# Altium schematic symbol library Minh_Lib.SchLib: 619 symbols (part 3 of 4) (continued)
## EEE-1VA101UP
designator EEE?  Supplier Part Number 1: PCE3950DKR-ND
Aluminum Electrolytic Capacitor, 100UF, 35V, 20%, SMD, Full Reel; Manufacturer: Panasonic; Manufacturer Part Number: EEE-1VA101UP; Dielectric Material: Aluminium; Ripple Current: 140mA; Polarity: Polar; Life (Hours): 2000Hour; Leakage Current: 35uA; Supplier 1: Digi-Key; RoHS: Yes; Category: Aluminum Electrolytic Capacitors; Pricing 1: 1=0.65000, 10=0.46000, 50=0.34760, 100=0.30270 (USD); Mount: Surface Mount,PCB; Case/Package: Radial; Contact Plating: Tin; Min Operating Temperature: -40°C; Max Operating Temperature: 85°C; Capacitance: 100uF; Tolerance: 20%; Voltage Rating: 35V; Packaging: Tape and Reel; Voltage Rating (DC): 35V; Package Quantity: 500; Termination: SMD/SMT; Ripple Current (AC): 140mA; Voltage: 35V; Series: S; Construction: Cylindrical; Diameter: 8mm; Length: 10.5mm; Height: 10.2mm; Height - Seated (Max): 0.402inch; Radiation Hardening: No; Lead Free: Lead Free; RoHS Compliant: Yes; REACH SVHC: No SVHC; ComponentLink1URL: https://datasheet.ciiva.com/43470/aba0000ce2-43470686.pdf?src-supplier=Farnell; ComponentLink1Description: https://datasheet.ciiva.com/43470/aba0000ce2-43470686.pdf?src-supplier=Farnell; ComponentLink2URL: https://datasheet.ciiva.com/46378/aba0000ce2-46378343.pdf?src-supplier=Element14; ComponentLink2Description: https://datasheet.ciiva.com/46378/aba0000ce2-46378343.pdf?src-supplier=Element14; ComponentLink3URL: https://datasheet.ciiva.com/31414/aba0000ce2-31414694.pdf?src-supplier=Farnell; ComponentLink3Description: https://datasheet.ciiva.com/31414/aba0000ce2-31414694.pdf?src-supplier=Farnell; ComponentLink4URL: https://datasheet.ciiva.com/46374/aba0000ce2-46374429.pdf?src-supplier=Element14; ComponentLink4Description: https://datasheet.ciiva.com/46374/aba0000ce2-46374429.pdf?src-supplier=Element14; ComponentLink5URL: https://datasheet.ciiva.com/24024/aba0000ce2-40801-24024846.pdf?src-supplier=Mouser; ComponentLink5Description: https://datasheet.ciiva.com/24024/aba0000ce2-40801-24024846.pdf?src-supplier=Mouser; ComponentLink6URL: https://datasheet.ciiva.com/14601/70255710-14601464.pdf?src-supplier=Allied+Electronics; ComponentLink6Description: https://datasheet.ciiva.com/14601/70255710-14601464.pdf?src-supplier=Allied+Electronics; ComponentLink7URL: https://datasheet.ciiva.com/14599/70255710-14599016.pdf?src-supplier=Allied+Electronics; ComponentLink7Description: https://datasheet.ciiva.com/14599/70255710-14599016.pdf?src-supplier=Allied+Electronics; ComponentLink8URL: https://datasheet.ciiva.com/11680/aba0000ce2-11680429.pdf?src-supplier=Avnet; ComponentLink8Description: https://datasheet.ciiva.com/11680/aba0000ce2-11680429.pdf?src-supplier=Avnet; ComponentLink9URL: https://datasheet.ciiva.com/16212/aba0000ce2-16212218.pdf?src-supplier=Future+Electronics; ComponentLink9Description: https://datasheet.ciiva.com/16212/aba0000ce2-16212218.pdf?src-supplier=Future+Electronics; ComponentLink10URL: https://datasheet.ciiva.com/17535/aba0000ce2-17535486.pdf?src-supplier=Avnet+Europe; ComponentLink10Description: https://datasheet.ciiva.com/17535/aba0000ce2-17535486.pdf?src-supplier=Avnet+Europe
footprint CAPACITOR/ALU - SIZE F/SMD - 8X10.2 (CAPACITOR  -  ALUMINIUM - SIZE F / EEEFK - SMD)
pins: 1, 2
text: +

## EEE-1VA101XP
designator EEE?  Supplier Part Number 1: 1763750
Cap Aluminum 100uF 35V 20% (6.3 X 7.7mm) SMD 132mA 2000 hr 85°C T/R; Manufacturer: Panasonic; Manufacturer Part Number: EEE-1VA101XP; Polarity: Polar; Life (Hours): 2000Hour; Leakage Current: 3uA; Supplier 1: RSComponents; RoHS: Yes; Category: Aluminum Electrolytic Capacitors; Stock 1: 375; Pricing 1: 900=0.19000, 900=0.13700 (USD); Mount: Surface Mount,PCB; Case/Package: Radial; Number of Pins: 8; Contact Plating: Tin; Min Operating Temperature: -40°C; Max Operating Temperature: 85°C; Capacitance: 100uF; Voltage Rating: 35V; Tolerance: 20%; Ripple Current: 132mA; Packaging: Tape and Reel; Package Quantity: 900; Voltage Rating (DC): 35V; Termination: SMD/SMT; Ripple Current (AC): 132mA; Voltage: 35V; Series: S; Construction: Cylindrical; Diameter: 6.3mm; Length: 8mm; Height: 7.7mm; Height - Seated (Max): 0.303inch; Radiation Hardening: No; Lead Free: Lead Free; RoHS Compliant: Yes; REACH SVHC: No SVHC; ComponentLink1URL: https://datasheet.ciiva.com/46378/aba0000ce2-46378341.pdf?src-supplier=Element14; ComponentLink1Description: https://datasheet.ciiva.com/46378/aba0000ce2-46378341.pdf?src-supplier=Element14; ComponentLink2URL: https://datasheet.ciiva.com/31414/aba0000ce2-31414696.pdf?src-supplier=Farnell; ComponentLink2Description: https://datasheet.ciiva.com/31414/aba0000ce2-31414696.pdf?src-supplier=Farnell; ComponentLink3URL: https://datasheet.ciiva.com/46374/aba0000ce2-46374427.pdf?src-supplier=Element14; ComponentLink3Description: https://datasheet.ciiva.com/46374/aba0000ce2-46374427.pdf?src-supplier=Element14; ComponentLink4URL: https://datasheet.ciiva.com/24068/aba0000ce2-40801-24068089.pdf?src-supplier=Mouser; ComponentLink4Description: https://datasheet.ciiva.com/24068/aba0000ce2-40801-24068089.pdf?src-supplier=Mouser; ComponentLink5URL: https://datasheet.ciiva.com/14591/70255710-14591771.pdf?src-supplier=Allied+Electronics; ComponentLink5Description: https://datasheet.ciiva.com/14591/70255710-14591771.pdf?src-supplier=Allied+Electronics; ComponentLink6URL: https://datasheet.ciiva.com/14600/70255710-14600731.pdf?src-supplier=Allied+Electronics; ComponentLink6Description: https://datasheet.ciiva.com/14600/70255710-14600731.pdf?src-supplier=Allied+Electronics; ComponentLink7URL: https://datasheet.ciiva.com/11673/aba0000ce2-11673887.pdf?src-supplier=Avnet; ComponentLink7Description: https://datasheet.ciiva.com/11673/aba0000ce2-11673887.pdf?src-supplier=Avnet; ComponentLink8URL: https://datasheet.ciiva.com/30170/11aba0000ce2-30170103.pdf?src-supplier=Onlinecomponents.com; ComponentLink8Description: https://datasheet.ciiva.com/30170/11aba0000ce2-30170103.pdf?src-supplier=Onlinecomponents.com; ComponentLink9URL: https://datasheet.ciiva.com/17535/aba0000ce2-17535510.pdf?src-supplier=Avnet+Europe; ComponentLink9Description: https://datasheet.ciiva.com/17535/aba0000ce2-17535510.pdf?src-supplier=Avnet+Europe
footprint CAPACITOR/ALU - SIZE D8/SMD - 6.3X7.7 (CAPACITOR  -  ALUMINIUM - SIZE D8 / EEEFK - SMD)
pins: 1, 2
text: +

## EEE-1VA220SP
designator EEE?  Supplier Part Number 1: 5370023
Cap Aluminum 22uF 35V 20% (6.3 X 5.4mm) SMD 60mA 2000h 85 C T/R; Manufacturer: Panasonic; Manufacturer Part Number: EEE-1VA220SP; Dielectric Material: Aluminium; Life (Hours): 2000Hour; Leakage Current: 3uA; Lead Length: 2.6mm; Supplier 1: RSComponents; RoHS: Yes; Category: Aluminum Electrolytic Capacitors; Stock 1: 95; Pricing 1: 5=0.29900, 50=0.15500, 250=0.10500, 500=0.10000, 2500=0.08300, 5=0.21600, 50=0.11200, 250=0.07600, 500=0.07200, 2500=0.06000 (USD); Mount: Surface Mount,PCB; Case/Package: Radial; Number of Pins: 2; Contact Plating: Tin; Min Operating Temperature: -40°C; Max Operating Temperature: 85°C; Capacitance: 22uF; Tolerance: 20%; Voltage Rating (DC): 35V; Voltage Rating: 35V; Packaging: Tape and Reel; Package Quantity: 1; Termination: SMD/SMT; Series: S; Construction: Cylindrical; Ripple Current: 60mA; Ripple Current (AC): 60mA; Voltage: 35V; Diameter: 6.3mm; Length: 5.5mm; Width: 6.6mm; Height: 5.4mm; Height - Seated (Max): 0.213inch; Lead Pitch: 1.8mm; Radiation Hardening: No; Lead Free: Lead Free; RoHS Compliant: Yes; REACH SVHC: No SVHC; ComponentLink1URL: https://datasheet.ciiva.com/11778/0900766b8078636e-11778914.pdf?src-supplier=RSComponents; ComponentLink1Description: https://datasheet.ciiva.com/11778/0900766b8078636e-11778914.pdf?src-supplier=RSComponents; ComponentLink2URL: https://datasheet.ciiva.com/15166/getdatasheetpartid-135375-15166031.pdf?src-supplier=Verical; ComponentLink2Description: https://datasheet.ciiva.com/15166/getdatasheetpartid-135375-15166031.pdf?src-supplier=Verical; ComponentLink3URL: https://datasheet.ciiva.com/6085/aba0000ce2-6085109.pdf?src-supplier=Farnell; ComponentLink3Description: https://datasheet.ciiva.com/6085/aba0000ce2-6085109.pdf?src-supplier=Farnell; ComponentLink4URL: https://datasheet.ciiva.com/46376/aba0000ce2-46376415.pdf?src-supplier=Element14; ComponentLink4Description: https://datasheet.ciiva.com/46376/aba0000ce2-46376415.pdf?src-supplier=Element14
footprint CAPACITOR/ALU - SIZE D/SMD - 6.3X5.4 (CAPACITOR  -  ALUMINIUM - SIZE D / EEEFK - SMD)
pins: 1, 2
text: +

## EEE-1VA220WR
designator EEE?  Supplier Part Number 1: EEE-1VA220WR
Cap Aluminum 22uF 35V 20% (5 X 5.4mm) SMD 36mA 1000 hr 85°C T/R; Manufacturer: Panasonic; Dielectric Material: Aluminium; Life (Hours): 1000Hour; Leakage Current: 7.7uA; Supplier 1: Arrow Electronics; Manufacturer Part Number: EEE-1VA220WR; RoHS: Yes; Category: Aluminum Electrolytic Capacitors; Stock 1: 1; Pricing 1: 1=0.16660 (USD); Mount: Surface Mount,PCB; Case/Package: Radial; Contact Plating: Tin; Min Operating Temperature: -40°C; Max Operating Temperature: 85°C; Capacitance: 22uF; Tolerance: 20%; Voltage Rating (DC): 35V; Voltage Rating: 35V; Packaging: Tape and Reel; Package Quantity: 1; Termination: SMD/SMT; Ripple Current (AC): 36mA; Ripple Current: 36mA; Voltage: 35V; Series: S; Construction: Cylindrical; Diameter: 5mm; Length: 5.5mm; Height: 5.4mm; Height - Seated (Max): 0.213inch; Radiation Hardening: No; REACH SVHC: No SVHC; Lead Free: Lead Free; RoHS Compliant: Yes; ComponentLink1URL: https://datasheet.ciiva.com/31414/aba0000ce2-31414697.pdf?src-supplier=Farnell; ComponentLink1Description: https://datasheet.ciiva.com/31414/aba0000ce2-31414697.pdf?src-supplier=Farnell; ComponentLink2URL: https://datasheet.ciiva.com/46374/aba0000ce2-46374426.pdf?src-supplier=Element14; ComponentLink2Description: https://datasheet.ciiva.com/46374/aba0000ce2-46374426.pdf?src-supplier=Element14; ComponentLink3URL: https://datasheet.ciiva.com/24027/aba0000ce2-40801-24027849.pdf?src-supplier=Mouser; ComponentLink3Description: https://datasheet.ciiva.com/24027/aba0000ce2-40801-24027849.pdf?src-supplier=Mouser; ComponentLink4URL: https://datasheet.ciiva.com/14604/70255710-14604703.pdf?src-supplier=Allied+Electronics; ComponentLink4Description: https://datasheet.ciiva.com/14604/70255710-14604703.pdf?src-supplier=Allied+Electronics; ComponentLink5URL: https://datasheet.ciiva.com/2983/aba0000ce2-2983925.pdf?src-supplier=Avnet; ComponentLink5Description: https://datasheet.ciiva.com/2983/aba0000ce2-2983925.pdf?src-supplier=Avnet; ComponentLink6URL: https://datasheet.ciiva.com/16388/aba0000ce2-16388681.pdf?src-supplier=Future+Electronics; ComponentLink6Description: https://datasheet.ciiva.com/16388/aba0000ce2-16388681.pdf?src-supplier=Future+Electronics; ComponentLink7URL: https://datasheet.ciiva.com/2985/aba0000ce2-2985217.pdf?src-supplier=Avnet; ComponentLink7Description: https://datasheet.ciiva.com/2985/aba0000ce2-2985217.pdf?src-supplier=Avnet; ComponentLink8URL: https://datasheet.ciiva.com/17536/aba0000ce2-17536586.pdf?src-supplier=Avnet+Europe; ComponentLink8Description: https://datasheet.ciiva.com/17536/aba0000ce2-17536586.pdf?src-supplier=Avnet+Europe
footprint CAPACITOR/ALU - SIZE C/SMD - 5X5.4 (CAPACITOR  -  ALUMINIUM - SIZE C / EEEFK - SMD)
pins: 1, 2
text: +

## EEE-1VA221P
designator EEE?  Supplier Part Number 1: EEE-1VA221P
Cap Aluminum 220uF 35V 20% (10 X 10.2mm) SMD 310mA 2000h 85°C T/R; Manufacturer: Panasonic; Life (Hours): 2000Hour; Leakage Current: 3uA; Dissipation Factor: 0.14%; Supplier 1: Arrow Electronics; Manufacturer Part Number: EEE-1VA221P; RoHS: Yes; Category: Aluminum Electrolytic Capacitors; Stock 1: 1; Pricing 1: 1=0.55570 (USD); Mount: Surface Mount,PCB; Case/Package: Radial; Contact Plating: Tin; Min Operating Temperature: -40°C; Max Operating Temperature: 85°C; Capacitance: 220uF; Tolerance: 20%; Voltage Rating: 35V; Voltage Rating (DC): 35V; Packaging: Tape and Reel; Ripple Current: 310mA; Package Quantity: 1; Termination: SMD/SMT; Series: S; Ripple Current (AC): 310mA; Voltage: 35V; Construction: Cylindrical; Diameter: 10mm; Length: 10.2mm; Height: 10.2mm; Height - Seated (Max): 0.402inch; Radiation Hardening: No; RoHS Compliant: Yes; REACH SVHC: No SVHC; Lead Free: Lead Free; ComponentLink1URL: https://datasheet.ciiva.com/11779/0900766b808a016a-11779838.pdf?src-supplier=RSComponents; ComponentLink1Description: https://datasheet.ciiva.com/11779/0900766b808a016a-11779838.pdf?src-supplier=RSComponents; ComponentLink2URL: https://datasheet.ciiva.com/31414/aba0000ce2-31414698.pdf?src-supplier=Farnell; ComponentLink2Description: https://datasheet.ciiva.com/31414/aba0000ce2-31414698.pdf?src-supplier=Farnell; ComponentLink3URL: https://datasheet.ciiva.com/46374/aba0000ce2-46374425.pdf?src-supplier=Element14; ComponentLink3Description: https://datasheet.ciiva.com/46374/aba0000ce2-46374425.pdf?src-supplier=Element14; ComponentLink4URL: https://datasheet.ciiva.com/24069/aba0000ce2-40801-24069609.pdf?src-supplier=Mouser; ComponentLink4Description: https://datasheet.ciiva.com/24069/aba0000ce2-40801-24069609.pdf?src-supplier=Mouser; ComponentLink5URL: https://datasheet.ciiva.com/14592/70255710-14592303.pdf?src-supplier=Allied+Electronics; ComponentLink5Description: https://datasheet.ciiva.com/14592/70255710-14592303.pdf?src-supplier=Allied+Electronics; ComponentLink6URL: https://datasheet.ciiva.com/2985/aba0000ce2-2985220.pdf?src-supplier=Avnet; ComponentLink6Description: https://datasheet.ciiva.com/2985/aba0000ce2-2985220.pdf?src-supplier=Avnet; ComponentLink7URL: https://datasheet.ciiva.com/16432/aba0000ce2-16432892.pdf?src-supplier=Future+Electronics; ComponentLink7Description: https://datasheet.ciiva.com/16432/aba0000ce2-16432892.pdf?src-supplier=Future+Electronics; ComponentLink8URL: https://datasheet.ciiva.com/2985/aba0000ce2-2985221.pdf?src-supplier=Avnet; ComponentLink8Description: https://datasheet.ciiva.com/2985/aba0000ce2-2985221.pdf?src-supplier=Avnet; ComponentLink9URL: https://datasheet.ciiva.com/30062/11aba0000ce2-30062150.pdf?src-supplier=Onlinecomponents.com; ComponentLink9Description: https://datasheet.ciiva.com/30062/11aba0000ce2-30062150.pdf?src-supplier=Onlinecomponents.com; ComponentLink10URL: https://datasheet.ciiva.com/17537/aba0000ce2-17537193.pdf?src-supplier=Avnet+Europe; ComponentLink10Description: https://datasheet.ciiva.com/17537/aba0000ce2-17537193.pdf?src-supplier=Avnet+Europe; ComponentLink11URL: https://datasheet.ciiva.com/16539/aba0000ce2-16539957.pdf?src-supplier=Avnet+Asia; ComponentLink11Description: https://datasheet.ciiva.com/16539/aba0000ce2-16539957.pdf?src-supplier=Avnet+Asia
footprint CAPACITOR/ALU - SIZE G/SMD - 10X10.2 (CAPACITOR  -  ALUMINIUM - SIZE G / EEEFK - SMD)
pins: 1, 2
text: +

## EEE-1VA221UP
designator EEE?  Supplier Part Number 1: 1763751
Cap Aluminum 220uF 35V 20% (8 X 10.2mm) SMD 200mA 2000h 85°C T/R; Manufacturer: Panasonic; Manufacturer Part Number: EEE-1VA221UP; Life (Hours): 2000Hour; Supplier 1: RSComponents; RoHS: Yes; Category: Aluminum Electrolytic Capacitors; Stock 1: 21; Pricing 1: 500=0.39200, 1000=0.37700, 2000=0.36400, 4000=0.32100, 500=0.28300, 1000=0.27200, 2000=0.26300, 4000=0.23200 (USD); Mount: Surface Mount,PCB; Case/Package: Radial; Contact Plating: Tin; Min Operating Temperature: -40°C; Max Operating Temperature: 85°C; Packaging: Tape and Reel; Capacitance: 220uF; Tolerance: 20%; Voltage Rating: 35V; Ripple Current: 200mA; Package Quantity: 1; Voltage Rating (DC): 35V; Termination: SMD/SMT; Series: S; Ripple Current (AC): 200mA; Construction: Cylindrical; Diameter: 8mm; Length: 10.5mm; Height: 10.2mm; Height - Seated (Max): 0.402inch; Radiation Hardening: No; REACH SVHC: Unknown; Lead Free: Lead Free; RoHS Compliant: Yes; ComponentLink1URL: https://datasheet.ciiva.com/14605/70255710-14605118.pdf?src-supplier=Allied+Electronics; ComponentLink1Description: https://datasheet.ciiva.com/14605/70255710-14605118.pdf?src-supplier=Allied+Electronics; ComponentLink2URL: https://datasheet.ciiva.com/14591/70255710-14591990.pdf?src-supplier=Allied+Electronics; ComponentLink2Description: https://datasheet.ciiva.com/14591/70255710-14591990.pdf?src-supplier=Allied+Electronics; ComponentLink3URL: https://datasheet.ciiva.com/2985/aba0000ce2-2985224.pdf?src-supplier=Avnet; ComponentLink3Description: https://datasheet.ciiva.com/2985/aba0000ce2-2985224.pdf?src-supplier=Avnet; ComponentLink4URL: https://datasheet.ciiva.com/16201/aba0000ce2-16201527.pdf?src-supplier=Future+Electronics; ComponentLink4Description: https://datasheet.ciiva.com/16201/aba0000ce2-16201527.pdf?src-supplier=Future+Electronics
footprint CAPACITOR/ALU - SIZE F/SMD - 8X10.2 (CAPACITOR  -  ALUMINIUM - SIZE F / EEEFK - SMD)
pins: 1, 2
text: +

## EEE-1VA330P
designator EEE?  Supplier Part Number 1: PCE3956CT-ND
Cap Aluminum 33uF 35V 20% (8 X 6.2mm) SMD 130mA 2000 hr 85°C T/R; Manufacturer: Panasonic; Manufacturer Part Number: EEE-1VA330P; Life (Hours): 2000Hour; Supplier 1: Digi-Key; RoHS: Yes; Category: Aluminum Electrolytic Capacitors; Stock 1: 37; Pricing 1: 1=0.50000, 10=0.35500, 50=0.26800, 100=0.23350, 500=0.17296 (USD); Mount: Surface Mount,PCB; Case/Package: Radial; Min Operating Temperature: -40°C; Max Operating Temperature: 85°C; Capacitance: 33uF; Tolerance: 20%; Voltage Rating (DC): 35V; Ripple Current: 130mA; Voltage Rating: 35V; Packaging: Tape and Reel; Package Quantity: 1000; Termination: SMD/SMT; Series: S; Construction: Cylindrical; Diameter: 8mm; Length: 6.5mm; Height: 6.2mm; Height - Seated (Max): 0.244inch; Radiation Hardening: No; Lead Free: Lead Free; RoHS Compliant: Yes; ComponentLink1URL: https://datasheet.ciiva.com/14604/70255710-14604362.pdf?src-supplier=Allied+Electronics; ComponentLink1Description: https://datasheet.ciiva.com/14604/70255710-14604362.pdf?src-supplier=Allied+Electronics; ComponentLink2URL: https://datasheet.ciiva.com/17535/aba0000ce2-17535548.pdf?src-supplier=Avnet+Europe; ComponentLink2Description: https://datasheet.ciiva.com/17535/aba0000ce2-17535548.pdf?src-supplier=Avnet+Europe; ComponentLink3URL: https://datasheet.ciiva.com/30217/11aba0000ce2-30217101.pdf?src-supplier=Onlinecomponents.com; ComponentLink3Description: https://datasheet.ciiva.com/30217/11aba0000ce2-30217101.pdf?src-supplier=Onlinecomponents.com; ComponentLink4URL: https://datasheet.ciiva.com/10330/aba0000ce2-10330999.pdf?src-supplier=Avnet; ComponentLink4Description: https://datasheet.ciiva.com/10330/aba0000ce2-10330999.pdf?src-supplier=Avnet; ComponentLink5URL: https://datasheet.ciiva.com/24026/aba0000ce2-40801-24026328.pdf?src-supplier=Mouser; ComponentLink5Description: https://datasheet.ciiva.com/24026/aba0000ce2-40801-24026328.pdf?src-supplier=Mouser
footprint CAPACITOR/ALU - SIZE E/SMD - 8X6.2 (CAPACITOR  -  ALUMINIUM - SIZE E / EEEFK - SMD)
pins: 1, 2
text: +

## EEE-1VA330WP
designator EEE?  Supplier Part Number 1: EEE-1VA330WP
Cap Aluminum 33uF 35V 20% (6.3 X 5.4mm) SMD 60mA 1000 hr 85°C T/R; Manufacturer: Panasonic; Life (Hours): 1000Hour; Supplier 1: Arrow Electronics; Manufacturer Part Number: EEE-1VA330WP; RoHS: Yes; Category: Aluminum Electrolytic Capacitors; Stock 1: 22; Pricing 1: 1=0.39100, 10=0.29300 (USD); Mount: Surface Mount,PCB; Case/Package: Radial; Contact Plating: Tin; Min Operating Temperature: -40°C; Max Operating Temperature: 85°C; Capacitance: 33uF; Tolerance: 20%; Voltage Rating (DC): 35V; Voltage Rating: 35V; Ripple Current: 60mA; Packaging: Tape and Reel; Package Quantity: 1; Ripple Current (AC): 60mA; Termination: SMD/SMT; Series: S; Construction: Cylindrical; Diameter: 6.3mm; Length: 5.5mm; Height: 5.4mm; Height - Seated (Max): 0.213inch; Radiation Hardening: No; REACH SVHC: No SVHC; Lead Free: Lead Free; RoHS Compliant: Yes; ComponentLink1URL: https://datasheet.ciiva.com/43470/aba0000ce2-43470693.pdf?src-supplier=Farnell; ComponentLink1Description: https://datasheet.ciiva.com/43470/aba0000ce2-43470693.pdf?src-supplier=Farnell; ComponentLink2URL: https://datasheet.ciiva.com/17536/aba0000ce2-17536246.pdf?src-supplier=Avnet+Europe; ComponentLink2Description: https://datasheet.ciiva.com/17536/aba0000ce2-17536246.pdf?src-supplier=Avnet+Europe; ComponentLink3URL: https://datasheet.ciiva.com/30159/11aba0000ce2-30159029.pdf?src-supplier=Onlinecomponents.com; ComponentLink3Description: https://datasheet.ciiva.com/30159/11aba0000ce2-30159029.pdf?src-supplier=Onlinecomponents.com; ComponentLink4URL: https://datasheet.ciiva.com/46374/aba0000ce2-46374422.pdf?src-supplier=Element14; ComponentLink4Description: https://datasheet.ciiva.com/46374/aba0000ce2-46374422.pdf?src-supplier=Element14; ComponentLink5URL: https://datasheet.ciiva.com/24069/aba0000ce2-40801-24069739.pdf?src-supplier=Mouser; ComponentLink5Description: https://datasheet.ciiva.com/24069/aba0000ce2-40801-24069739.pdf?src-supplier=Mouser; ComponentLink6URL: https://datasheet.ciiva.com/31414/aba0000ce2-31414701.pdf?src-supplier=Farnell; ComponentLink6Description: https://datasheet.ciiva.com/31414/aba0000ce2-31414701.pdf?src-supplier=Farnell
footprint CAPACITOR/ALU - SIZE D/SMD - 6.3X5.4 (CAPACITOR  -  ALUMINIUM - SIZE D / EEEFK - SMD)
pins: 1, 2
text: +

## EEE-1VA331P
designator EEE?  Supplier Part Number 1: PCE3959DKR-ND
Cap Aluminum 330uF 35V 20% (10 X 10.2mm) SMD 350mA 2000 hr 85°C T/R; Manufacturer: Panasonic; Manufacturer Part Number: EEE-1VA331P; Polarity: Polar; Life (Hours): 2000Hour; Leakage Current: 3uA; Supplier 1: Digi-Key; RoHS: Yes; Category: Aluminum Electrolytic Capacitors; Pricing 1: 1=0.84000, 10=0.59100, 50=0.44700, 100=0.38940 (USD); Mount: Surface Mount,PCB; Case/Package: Radial; Contact Plating: Tin; Min Operating Temperature: -40°C; Max Operating Temperature: 85°C; Capacitance: 330uF; Voltage Rating: 35V; Packaging: Tape and Reel; Tolerance: 20%; Ripple Current: 350mA; Voltage Rating (DC): 35V; Package Quantity: 500; Termination: SMD/SMT; Ripple Current (AC): 350mA; Voltage: 35V; Series: S; Construction: Cylindrical; Diameter: 10mm; Length: 10.5mm; Height: 10.2mm; Height - Seated (Max): 0.402inch; Radiation Hardening: No; Lead Free: Lead Free; REACH SVHC: No SVHC; RoHS Compliant: Yes; ComponentLink1URL: https://datasheet.ciiva.com/43470/aba0000ce2-43470694.pdf?src-supplier=Farnell; ComponentLink1Description: https://datasheet.ciiva.com/43470/aba0000ce2-43470694.pdf?src-supplier=Farnell; ComponentLink2URL: https://datasheet.ciiva.com/31414/aba0000ce2-31414702.pdf?src-supplier=Farnell; ComponentLink2Description: https://datasheet.ciiva.com/31414/aba0000ce2-31414702.pdf?src-supplier=Farnell; ComponentLink3URL: https://datasheet.ciiva.com/46374/aba0000ce2-46374421.pdf?src-supplier=Element14; ComponentLink3Description: https://datasheet.ciiva.com/46374/aba0000ce2-46374421.pdf?src-supplier=Element14; ComponentLink4URL: https://datasheet.ciiva.com/24025/aba0000ce2-40801-24025561.pdf?src-supplier=Mouser; ComponentLink4Description: https://datasheet.ciiva.com/24025/aba0000ce2-40801-24025561.pdf?src-supplier=Mouser; ComponentLink5URL: https://datasheet.ciiva.com/14599/70255710-14599770.pdf?src-supplier=Allied+Electronics; ComponentLink5Description: https://datasheet.ciiva.com/14599/70255710-14599770.pdf?src-supplier=Allied+Electronics; ComponentLink6URL: https://datasheet.ciiva.com/14593/70255710-14593929.pdf?src-supplier=Allied+Electronics; ComponentLink6Description: https://datasheet.ciiva.com/14593/70255710-14593929.pdf?src-supplier=Allied+Electronics; ComponentLink7URL: https://datasheet.ciiva.com/16389/aba0000ce2-16389541.pdf?src-supplier=Future+Electronics; ComponentLink7Description: https://datasheet.ciiva.com/16389/aba0000ce2-16389541.pdf?src-supplier=Future+Electronics; ComponentLink8URL: https://datasheet.ciiva.com/30235/11aba0000ce2-30235093.pdf?src-supplier=Onlinecomponents.com; ComponentLink8Description: https://datasheet.ciiva.com/30235/11aba0000ce2-30235093.pdf?src-supplier=Onlinecomponents.com; ComponentLink9URL: https://datasheet.ciiva.com/17534/aba0000ce2-17534540.pdf?src-supplier=Avnet+Europe; ComponentLink9Description: https://datasheet.ciiva.com/17534/aba0000ce2-17534540.pdf?src-supplier=Avnet+Europe
footprint CAPACITOR/ALU - SIZE G/SMD - 10X10.2 (CAPACITOR  -  ALUMINIUM - SIZE G / EEEFK - SMD)
pins: 1, 2
text: +

## EEE-1VA470P
designator EEE?  Supplier Part Number 1: PCE3960DKR-ND
Cap Aluminum 47uF 35V 20% (8 X 6.2mm) SMD 165mA 2000h 85°C T/R; Manufacturer: Panasonic; Manufacturer Part Number: EEE-1VA470P; Life (Hours): 2000Hour; Leakage Current: 3uA; Supplier 1: Digi-Key; RoHS: Yes; Category: Aluminum Electrolytic Capacitors; Pricing 1: 1=0.50000, 10=0.35500, 50=0.26800, 100=0.23350, 500=0.17296 (USD); Mount: Surface Mount,PCB; Case/Package: Radial; Contact Plating: Tin; Min Operating Temperature: -40°C; Max Operating Temperature: 85°C; Capacitance: 47uF; Voltage Rating: 35V; Tolerance: 20%; Ripple Current: 165mA; Packaging: Tape and Reel; Package Quantity: 1; Voltage Rating (DC): 35V; Ripple Current (AC): 165mA; Termination: SMD/SMT; Voltage: 35V; Series: S; Construction: Cylindrical; Diameter: 8mm; Length: 6.5mm; Height: 6.2mm; Height - Seated (Max): 0.244inch; Radiation Hardening: No; REACH SVHC: No SVHC; Lead Free: Lead Free; RoHS Compliant: Yes; ComponentLink1URL: https://datasheet.ciiva.com/11779/0900766b808a016a-11779420.pdf?src-supplier=RSComponents; ComponentLink1Description: https://datasheet.ciiva.com/11779/0900766b808a016a-11779420.pdf?src-supplier=RSComponents; ComponentLink2URL: https://datasheet.ciiva.com/43470/aba0000ce2-43470696.pdf?src-supplier=Farnell; ComponentLink2Description: https://datasheet.ciiva.com/43470/aba0000ce2-43470696.pdf?src-supplier=Farnell; ComponentLink3URL: https://datasheet.ciiva.com/46378/aba0000ce2-46378334.pdf?src-supplier=Element14; ComponentLink3Description: https://datasheet.ciiva.com/46378/aba0000ce2-46378334.pdf?src-supplier=Element14; ComponentLink4URL: https://datasheet.ciiva.com/24068/aba0000ce2-40801-24068077.pdf?src-supplier=Mouser; ComponentLink4Description: https://datasheet.ciiva.com/24068/aba0000ce2-40801-24068077.pdf?src-supplier=Mouser; ComponentLink5URL: https://datasheet.ciiva.com/14603/70255710-14603512.pdf?src-supplier=Allied+Electronics; ComponentLink5Description: https://datasheet.ciiva.com/14603/70255710-14603512.pdf?src-supplier=Allied+Electronics; ComponentLink6URL: https://datasheet.ciiva.com/10331/aba0000ce2-10331001.pdf?src-supplier=Avnet; ComponentLink6Description: https://datasheet.ciiva.com/10331/aba0000ce2-10331001.pdf?src-supplier=Avnet; ComponentLink7URL: https://datasheet.ciiva.com/16396/aba0000ce2-16396505.pdf?src-supplier=Future+Electronics; ComponentLink7Description: https://datasheet.ciiva.com/16396/aba0000ce2-16396505.pdf?src-supplier=Future+Electronics; ComponentLink8URL: https://datasheet.ciiva.com/2985/aba0000ce2-2985232.pdf?src-supplier=Avnet; ComponentLink8Description: https://datasheet.ciiva.com/2985/aba0000ce2-2985232.pdf?src-supplier=Avnet; ComponentLink9URL: https://datasheet.ciiva.com/30083/11aba0000ce2-30083110.pdf?src-supplier=Onlinecomponents.com; ComponentLink9Description: https://datasheet.ciiva.com/30083/11aba0000ce2-30083110.pdf?src-supplier=Onlinecomponents.com; ComponentLink10URL: https://datasheet.ciiva.com/17530/aba0000ce2-17530157.pdf?src-supplier=Avnet+Europe; ComponentLink10Description: https://datasheet.ciiva.com/17530/aba0000ce2-17530157.pdf?src-supplier=Avnet+Europe
footprint CAPACITOR/ALU - SIZE E/SMD - 8X6.2 (CAPACITOR  -  ALUMINIUM - SIZE E / EEEFK - SMD)
pins: 1, 2
text: +

## EEE-1VA470WP
designator EEE?  Supplier Part Number 1: 667-EEE-1VA470WP
Cap Aluminum 47uF 35V 20% (6.3 X 5.4mm) SMD 70mA 1000h 85 C T/R; Manufacturer: Panasonic; Manufacturer Part Number: EEE-1VA470WP; Life (Hours): 1000Hour; Supplier 1: Mouser; RoHS: Yes; Category: Aluminum Electrolytic Capacitors; Stock 1: 70; Pricing 1: 1=0.45000, 10=0.31300, 50=0.31300, 100=0.18800, 500=0.14100, 1000=0.11800, 10000=0.11800 (USD); Mount: Surface Mount,PCB; Case/Package: Radial; Contact Plating: Tin; Min Operating Temperature: -40°C; Max Operating Temperature: 85°C; Capacitance: 47uF; Tolerance: 20%; Voltage Rating (DC): 35V; Voltage Rating: 35V; Ripple Current: 70mA; Packaging: Tape and Reel; Package Quantity: 1; Termination: SMD/SMT; Ripple Current (AC): 70mA; Series: S; Construction: Cylindrical; Diameter: 6.3mm; Length: 5.5mm; Height: 5.4mm; Height - Seated (Max): 0.213inch; Radiation Hardening: No; RoHS Compliant: Yes; Lead Free: Lead Free; REACH SVHC: Unknown; ComponentLink1URL: https://datasheet.ciiva.com/14598/70255710-14598937.pdf?src-supplier=Allied+Electronics; ComponentLink1Description: https://datasheet.ciiva.com/14598/70255710-14598937.pdf?src-supplier=Allied+Electronics; ComponentLink2URL: https://datasheet.ciiva.com/2983/aba0000ce2-2983927.pdf?src-supplier=Avnet; ComponentLink2Description: https://datasheet.ciiva.com/2983/aba0000ce2-2983927.pdf?src-supplier=Avnet; ComponentLink3URL: https://datasheet.ciiva.com/16507/aba0000ce2-16507965.pdf?src-supplier=Future+Electronics; ComponentLink3Description: https://datasheet.ciiva.com/16507/aba0000ce2-16507965.pdf?src-supplier=Future+Electronics; ComponentLink4URL: https://datasheet.ciiva.com/30206/11aba0000ce2-30206253.pdf?src-supplier=Onlinecomponents.com; ComponentLink4Description: https://datasheet.ciiva.com/30206/11aba0000ce2-30206253.pdf?src-supplier=Onlinecomponents.com; ComponentLink5URL: https://datasheet.ciiva.com/15165/getdatasheetpartid-86239-15165868.pdf?src-supplier=Verical; ComponentLink5Description: https://datasheet.ciiva.com/15165/getdatasheetpartid-86239-15165868.pdf?src-supplier=Verical
footprint CAPACITOR/ALU - SIZE D/SMD - 6.3X5.4 (CAPACITOR  -  ALUMINIUM - SIZE D / EEEFK - SMD)
pins: 1, 2
text: +

## EEE-2AA100P
designator EEE?  Supplier Part Number 1: PCE3965CT-ND
Cap Aluminum 10uF 100V 20% (8 X 10.2mm) SMD 85mA 2000 hr 85°C T/R; Manufacturer: Panasonic; Manufacturer Part Number: EEE-2AA100P; Polarity: Polar; Life (Hours): 2000Hour; Leakage Current: 3uA; Supplier 1: Digi-Key; RoHS: Yes; Category: Aluminum Electrolytic Capacitors; Pricing 1: 1=0.72000, 10=0.50600, 50=0.38260, 100=0.33320 (USD); Mount: Surface Mount,PCB; Case/Package: Radial; Min Operating Temperature: -40°C; Max Operating Temperature: 85°C; Capacitance: 10uF; Tolerance: 20%; Voltage Rating: 100V; Packaging: Tape and Reel; Ripple Current: 85mA; Package Quantity: 500; Voltage Rating (DC): 100V; Termination: SMD/SMT; Voltage: 100V; Ripple Current (AC): 85mA; Series: S; Construction: Cylindrical; Diameter: 8mm; Length: 10.5mm; Height: 10.2mm; Height - Seated (Max): 0.402inch; Radiation Hardening: No; Lead Free: Lead Free; RoHS Compliant: Yes; REACH SVHC: No SVHC; ComponentLink1URL: https://datasheet.ciiva.com/43470/aba0000ce2-43470698.pdf?src-supplier=Farnell; ComponentLink1Description: https://datasheet.ciiva.com/43470/aba0000ce2-43470698.pdf?src-supplier=Farnell; ComponentLink2URL: https://datasheet.ciiva.com/46378/aba0000ce2-46378332.pdf?src-supplier=Element14; ComponentLink2Description: https://datasheet.ciiva.com/46378/aba0000ce2-46378332.pdf?src-supplier=Element14; ComponentLink3URL: https://datasheet.ciiva.com/14604/70255710-14604650.pdf?src-supplier=Allied+Electronics; ComponentLink3Description: https://datasheet.ciiva.com/14604/70255710-14604650.pdf?src-supplier=Allied+Electronics; ComponentLink4URL: https://datasheet.ciiva.com/10331/aba0000ce2-10331003.pdf?src-supplier=Avnet; ComponentLink4Description: https://datasheet.ciiva.com/10331/aba0000ce2-10331003.pdf?src-supplier=Avnet; ComponentLink5URL: https://datasheet.ciiva.com/16390/aba0000ce2-16390477.pdf?src-supplier=Future+Electronics; ComponentLink5Description: https://datasheet.ciiva.com/16390/aba0000ce2-16390477.pdf?src-supplier=Future+Electronics; ComponentLink6URL: https://datasheet.ciiva.com/2985/aba0000ce2-2985239.pdf?src-supplier=Avnet; ComponentLink6Description: https://datasheet.ciiva.com/2985/aba0000ce2-2985239.pdf?src-supplier=Avnet; ComponentLink7URL: https://datasheet.ciiva.com/30142/11aba0000ce2-30142361.pdf?src-supplier=Onlinecomponents.com; ComponentLink7Description: https://datasheet.ciiva.com/30142/11aba0000ce2-30142361.pdf?src-supplier=Onlinecomponents.com; ComponentLink8URL: https://datasheet.ciiva.com/16539/aba0000ce2-16539958.pdf?src-supplier=Avnet+Asia; ComponentLink8Description: https://datasheet.ciiva.com/16539/aba0000ce2-16539958.pdf?src-supplier=Avnet+Asia
footprint CAPACITOR/ALU - SIZE F/SMD - 8X10.2 (CAPACITOR  -  ALUMINIUM - SIZE F / EEEFK - SMD)
pins: 1, 2
text: +

## EEE-2AA100UP
designator EEE?  Supplier Part Number 1: PCE3966DKR-ND
Cap Aluminum 10uF 100V 20% (8 X 6.2mm) SMD 50mA 2000h 85°C T/R; Manufacturer: Panasonic; Manufacturer Part Number: EEE-2AA100UP; Life (Hours): 2000Hour; Leakage Current: 3uA; Supplier 1: Digi-Key; RoHS: Yes; Category: Aluminum Electrolytic Capacitors; Pricing 1: 1=0.61000, 10=0.43300, 50=0.32760, 100=0.28530, 500=0.21136 (USD); Mount: Surface Mount,PCB; Case/Package: Radial; Contact Plating: Tin; Min Operating Temperature: -40°C; Max Operating Temperature: 85°C; Capacitance: 10uF; Voltage Rating: 100V; Ripple Current (AC): 50mA; Packaging: Tape and Reel; Tolerance: 20%; Ripple Current: 50mA; Voltage Rating (DC): 100V; Package Quantity: 1; Termination: SMD/SMT; Voltage: 100V; Series: S; Construction: Cylindrical; Diameter: 8mm; Length: 6.5mm; Height: 6.2mm; Height - Seated (Max): 0.244inch; Radiation Hardening: No; REACH SVHC: No SVHC; Lead Free: Lead Free; RoHS Compliant: Yes; ComponentLink1URL: https://datasheet.ciiva.com/43470/aba0000ce2-43470699.pdf?src-supplier=Farnell; ComponentLink1Description: https://datasheet.ciiva.com/43470/aba0000ce2-43470699.pdf?src-supplier=Farnell; ComponentLink2URL: https://datasheet.ciiva.com/46378/aba0000ce2-46378331.pdf?src-supplier=Element14; ComponentLink2Description: https://datasheet.ciiva.com/46378/aba0000ce2-46378331.pdf?src-supplier=Element14; ComponentLink3URL: https://datasheet.ciiva.com/24071/aba0000ce2-40801-24071850.pdf?src-supplier=Mouser; ComponentLink3Description: https://datasheet.ciiva.com/24071/aba0000ce2-40801-24071850.pdf?src-supplier=Mouser; ComponentLink4URL: https://datasheet.ciiva.com/14598/70255710-14598086.pdf?src-supplier=Allied+Electronics; ComponentLink4Description: https://datasheet.ciiva.com/14598/70255710-14598086.pdf?src-supplier=Allied+Electronics; ComponentLink5URL: https://datasheet.ciiva.com/17536/aba0000ce2-17536374.pdf?src-supplier=Avnet+Europe; ComponentLink5Description: https://datasheet.ciiva.com/17536/aba0000ce2-17536374.pdf?src-supplier=Avnet+Europe
footprint CAPACITOR/ALU - SIZE E/SMD - 8X6.2 (CAPACITOR  -  ALUMINIUM - SIZE E / EEEFK - SMD)
pins: 1, 2
text: +

## EEE-2AA220P
designator EEE?  Supplier Part Number 1: EEE-2AA220P
S Series 100 V 22 µF ±20% Surface Mount Aluminum Electrolytic Capacitor; Manufacturer: Panasonic; Capacitance: 22uF; Ripple Current: 85mA; Voltage Rating (DC): 100V; Polarity: Polar; Life (Hours): 2000Hour; Leakage Current: 3uA; Lead Diameter: 0.9mm; Supplier 1: Arrow Electronics; Manufacturer Part Number: EEE-2AA220P; RoHS: Yes; Category: Aluminum Electrolytic Capacitors; Stock 1: 1; Pricing 1: 1=0.74650 (USD); Mount: Surface Mount,PCB; Case/Package: Radial; Contact Plating: Tin; Min Operating Temperature: -40°C; Max Operating Temperature: 85°C; Tolerance: 20%; Packaging: Tape and Reel; Voltage Rating: 100V; Package Quantity: 500; Termination: SMD/SMT; Voltage: 100V; Series: Automotive, AEC-Q200, S; Construction: Cylindrical; Diameter: 10mm; Length: 10.5mm; Height: 10.2mm; Height - Seated (Max): 0.402inch; Lead Pitch: 4.6mm; Radiation Hardening: No; Lead Free: Lead Free; RoHS Compliant: Yes; ComponentLink1URL: https://datasheet.ciiva.com/24071/aba0000ce2-40801-24071231.pdf?src-supplier=Mouser; ComponentLink1Description: https://datasheet.ciiva.com/24071/aba0000ce2-40801-24071231.pdf?src-supplier=Mouser; ComponentLink2URL: https://datasheet.ciiva.com/16539/aba0000ce2-16539960.pdf?src-supplier=Avnet+Asia; ComponentLink2Description: https://datasheet.ciiva.com/16539/aba0000ce2-16539960.pdf?src-supplier=Avnet+Asia; ComponentLink3URL: https://datasheet.ciiva.com/11680/aba0000ce2-11680670.pdf?src-supplier=Avnet; ComponentLink3Description: https://datasheet.ciiva.com/11680/aba0000ce2-11680670.pdf?src-supplier=Avnet; ComponentLink4URL: https://datasheet.ciiva.com/15931/aba0000ce2-15931871.pdf?src-supplier=Onlinecomponents.com; ComponentLink4Description: https://datasheet.ciiva.com/15931/aba0000ce2-15931871.pdf?src-supplier=Onlinecomponents.com
footprint CAPACITOR/ALU - SIZE G/SMD - 10X10.2 (CAPACITOR  -  ALUMINIUM - SIZE G / EEEFK - SMD)
pins: 1, 2
text: +

## EEE-2AA220UP
designator EEE?  Supplier Part Number 1: PCE3968DKR-ND
Cap Aluminum 22uF 100V 20% (8 X 10.2mm) SMD 55mA 2000 hr 85°C T/R; Manufacturer: Panasonic; Manufacturer Part Number: EEE-2AA220UP; Life (Hours): 2000Hour; Leakage Current: 3uA; Supplier 1: Digi-Key; RoHS: Yes; Category: Aluminum Electrolytic Capacitors; Pricing 1: 1=0.78000, 10=0.55200, 50=0.41720, 100=0.36330 (USD); Mount: Surface Mount,PCB; Case/Package: Radial; Contact Plating: Tin; Min Operating Temperature: -40°C; Max Operating Temperature: 85°C; Capacitance: 22uF; Tolerance: 20%; Voltage Rating: 100V; Packaging: Tape and Reel; Ripple Current: 55mA; Voltage Rating (DC): 100V; Package Quantity: 1; Ripple Current (AC): 55mA; Termination: SMD/SMT; Voltage: 100V; Series: S; Construction: Cylindrical; Diameter: 8mm; Length: 10.5mm; Height: 10.2mm; Height - Seated (Max): 0.402inch; Radiation Hardening: No; REACH SVHC: Unknown; Lead Free: Lead Free; RoHS Compliant: Yes; ComponentLink1URL: https://datasheet.ciiva.com/31414/aba0000ce2-31414709.pdf?src-supplier=Farnell; ComponentLink1Description: https://datasheet.ciiva.com/31414/aba0000ce2-31414709.pdf?src-supplier=Farnell; ComponentLink2URL: https://datasheet.ciiva.com/30085/11aba0000ce2-30085671.pdf?src-supplier=Onlinecomponents.com; ComponentLink2Description: https://datasheet.ciiva.com/30085/11aba0000ce2-30085671.pdf?src-supplier=Onlinecomponents.com; ComponentLink3URL: https://datasheet.ciiva.com/2985/aba0000ce2-2985241.pdf?src-supplier=Avnet; ComponentLink3Description: https://datasheet.ciiva.com/2985/aba0000ce2-2985241.pdf?src-supplier=Avnet; ComponentLink4URL: https://datasheet.ciiva.com/46378/aba0000ce2-46378330.pdf?src-supplier=Element14; ComponentLink4Description: https://datasheet.ciiva.com/46378/aba0000ce2-46378330.pdf?src-supplier=Element14; ComponentLink5URL: https://datasheet.ciiva.com/43470/aba0000ce2-43470700.pdf?src-supplier=Farnell; ComponentLink5Description: https://datasheet.ciiva.com/43470/aba0000ce2-43470700.pdf?src-supplier=Farnell; ComponentLink6URL: https://datasheet.ciiva.com/14607/70255710-14607374.pdf?src-supplier=Allied+Electronics; ComponentLink6Description: https://datasheet.ciiva.com/14607/70255710-14607374.pdf?src-supplier=Allied+Electronics; ComponentLink7URL: https://datasheet.ciiva.com/46374/aba0000ce2-46374415.pdf?src-supplier=Element14; ComponentLink7Description: https://datasheet.ciiva.com/46374/aba0000ce2-46374415.pdf?src-supplier=Element14; ComponentLink8URL: https://datasheet.ciiva.com/24028/aba0000ce2-40801-24028121.pdf?src-supplier=Mouser; ComponentLink8Description: https://datasheet.ciiva.com/24028/aba0000ce2-40801-24028121.pdf?src-supplier=Mouser; ComponentLink9URL: https://datasheet.ciiva.com/16387/aba0000ce2-16387054.pdf?src-supplier=Future+Electronics; ComponentLink9Description: https://datasheet.ciiva.com/16387/aba0000ce2-16387054.pdf?src-supplier=Future+Electronics
footprint CAPACITOR/ALU - SIZE F/SMD - 8X10.2 (CAPACITOR  -  ALUMINIUM - SIZE F / EEEFK - SMD)
pins: 1, 2
text: +

## EEE-2AA330P
designator EEE?  Supplier Part Number 1: EEE-2AA330P
Cap Aluminum 33uF 100V 20% (10 X 10.2mm) SMD 90mA 2000h 85°C T/R; Manufacturer: Panasonic; Life (Hours): 2000Hour; Polarity: Polar; Leakage Current: 3uA; Supplier 1: Arrow Electronics; Manufacturer Part Number: EEE-2AA330P; RoHS: Yes; Category: Aluminum Electrolytic Capacitors; Stock 1: 1; Pricing 1: 1=0.61360 (USD); Mount: Surface Mount,PCB; Case/Package: Radial; Contact Plating: Tin; Min Operating Temperature: -40°C; Max Operating Temperature: 85°C; Capacitance: 33uF; Tolerance: 20%; Packaging: Tape and Reel; Voltage Rating: 100V; Voltage Rating (DC): 100V; Package Quantity: 1; Termination: SMD/SMT; Ripple Current: 90mA; Ripple Current (AC): 90mA; Voltage: 100V; Series: S; Construction: Cylindrical; Diameter: 10mm; Length: 10.5mm; Height: 10.2mm; Height - Seated (Max): 0.402inch; Radiation Hardening: No; Lead Free: Lead Free; RoHS Compliant: Yes; REACH SVHC: No SVHC; ComponentLink1URL: https://datasheet.ciiva.com/43470/aba0000ce2-43470701.pdf?src-supplier=Farnell; ComponentLink1Description: https://datasheet.ciiva.com/43470/aba0000ce2-43470701.pdf?src-supplier=Farnell; ComponentLink2URL: https://datasheet.ciiva.com/46378/aba0000ce2-46378329.pdf?src-supplier=Element14; ComponentLink2Description: https://datasheet.ciiva.com/46378/aba0000ce2-46378329.pdf?src-supplier=Element14; ComponentLink3URL: https://datasheet.ciiva.com/31414/aba0000ce2-31414710.pdf?src-supplier=Farnell; ComponentLink3Description: https://datasheet.ciiva.com/31414/aba0000ce2-31414710.pdf?src-supplier=Farnell; ComponentLink4URL: https://datasheet.ciiva.com/46374/aba0000ce2-46374414.pdf?src-supplier=Element14; ComponentLink4Description: https://datasheet.ciiva.com/46374/aba0000ce2-46374414.pdf?src-supplier=Element14; ComponentLink5URL: https://datasheet.ciiva.com/14604/70255710-14604908.pdf?src-supplier=Allied+Electronics; ComponentLink5Description: https://datasheet.ciiva.com/14604/70255710-14604908.pdf?src-supplier=Allied+Electronics; ComponentLink6URL: https://datasheet.ciiva.com/14604/70255710-14604425.pdf?src-supplier=Allied+Electronics; ComponentLink6Description: https://datasheet.ciiva.com/14604/70255710-14604425.pdf?src-supplier=Allied+Electronics; ComponentLink7URL: https://datasheet.ciiva.com/11675/aba0000ce2-11675783.pdf?src-supplier=Avnet; ComponentLink7Description: https://datasheet.ciiva.com/11675/aba0000ce2-11675783.pdf?src-supplier=Avnet; ComponentLink8URL: https://datasheet.ciiva.com/16389/aba0000ce2-16389542.pdf?src-supplier=Future+Electronics; ComponentLink8Description: https://datasheet.ciiva.com/16389/aba0000ce2-16389542.pdf?src-supplier=Future+Electronics; ComponentLink9URL: https://datasheet.ciiva.com/2985/aba0000ce2-2985242.pdf?src-supplier=Avnet; ComponentLink9Description: https://datasheet.ciiva.com/2985/aba0000ce2-2985242.pdf?src-supplier=Avnet; ComponentLink10URL: https://datasheet.ciiva.com/30224/11aba0000ce2-30224876.pdf?src-supplier=Onlinecomponents.com; ComponentLink10Description: https://datasheet.ciiva.com/30224/11aba0000ce2-30224876.pdf?src-supplier=Onlinecomponents.com; ComponentLink11URL: https://datasheet.ciiva.com/16539/aba0000ce2-16539962.pdf?src-supplier=Avnet+Asia; ComponentLink11Description: https://datasheet.ciiva.com/16539/aba0000ce2-16539962.pdf?src-supplier=Avnet+Asia
footprint CAPACITOR/ALU - SIZE G/SMD - 10X10.2 (CAPACITOR  -  ALUMINIUM - SIZE G / EEEFK - SMD)
pins: 1, 2
text: +

## ESP32-WROOM-32D (8MB)
designator M?  Supplier Part Number 1: 1904-1024-1-ND
SMD Module, ESP32-D0WD, 64MBITS Spi Flash, Uart Mode, Pcb Antenna; Manufacturer: Espressif Systems; Manufacturer Part Number: ESP32-WROOM-32D (8MB); Interface: I2C,SPI,GPIO,PWM,SDIO,UART; Frequency: 2.5GHz; Data Rate: 150Mbps; Sensitivity: -98dBm; Memory Size: 536KB; Supplier 1: Digi-Key; RoHS: No; Category: RF Receivers, Transceivers; Mount: Surface Mount; Case/Package: SMD/SMT; Min Operating Temperature: -40°C; Max Operating Temperature: 85°C; Packaging: Tape and Reel; ComponentLink1URL: https://www.espressif.com/sites/default/files/documentation/esp32-wroom-32d_esp32-wroom-32u_datasheet_en.pdf?src-supplier=Digi-Key; ComponentLink1Description: https://www.espressif.com/sites/default/files/documentation/esp32-wroom-32d_esp32-wroom-32u_datasheet_en.pdf?src-supplier=Digi-Key
footprint ESP32-WROOM-32D
pins: 1 GND (power), 2 3V3 (power), 3 EN (in), 4 SENSOR_VP (in), 5 SENSOR_VN (in), 6 IO34 (in), 7 IO35 (in), 8 IO32 (io), 9 IO33 (io), 10 IO25 (io), 11 IO26 (io), 12 IO27 (io), 13 IO14 (io), 14 IO12 (io), 15 GND (power), 16 IO13 (io), 17 SHD/SD2 (io), 18 SWP/SD3 (io), 19 SCS/CMD (io), 20 SCK/CLK (io), 21 SDO/SD0 (io), 22 SDI/SD1 (io), 23 IO15 (io), 24 IO2 (io), 25 IO0 (io), 26 IO4 (io), 27 IO16 (io), 28 IO17 (io), 29 IO5 (io), 30 IO18 (io), 31 IO19 (io), 33 IO21 (io), 34 RXD0 (io), 35 TXD0 (io), 36 IO22 (io), 37 IO23 (io), 38 GND (power), 39_1 GND (power), 39_2 GND (power), 39_3 GND (power), 39_4 GND (power), 39_5 GND (power), 39_6 GND (power), 39_7 GND (power), 39_8 GND (power), 39_9 GND (power), 39_10 GND (power), 39_11 GND (power), 39_12 GND (power), 39_13 GND (power), 39_14 GND (power), 39_15 GND (power), 39_16 GND (power), 39_17 GND (power), 39_18 GND (power), 39_19 GND (power), 39_20 GND (power), 39_21 GND (power)

## ESP32-WROOM-32U (8MB)
designator U?  Supplier Part Number 1: 1904-1027-1-ND
SMD Module, ESP32-D0WD, 64MBITS Spi Flash, Uart Mode, U.fl Antenna Connector; Manufacturer: Espressif Systems; Manufacturer Part Number: ESP32-WROOM-32U (8MB); Interface: I2C,SPI,GPIO,PWM,SDIO,UART; Frequency: 2.5GHz; Data Rate: 150Mbps; Sensitivity: -98dBm; Memory Size: 536KB; Resistance: 4.48kR; Tolerance: 0.1%; Max Power Dissipation: 125mW; Temperature Coefficient: 25ppm/°C; Supplier 1: Digi-Key; RoHS: No; Category: RF Receivers, Transceivers; Mount: Surface Mount; Case/Package: SMD/SMT; Case Code (Imperial): 0805; Case Code (Metric): 2012; Min Operating Temperature: -40°C; Max Operating Temperature: 85°C; Packaging: Cut Tape; Resistor Type: Thin Film; Number of Terminations: 2; ComponentLink1URL: https://www.espressif.com/sites/default/files/documentation/esp32-wroom-32d_esp32-wroom-32u_datasheet_en.pdf?src-supplier=Digi-Key; ComponentLink1Description: https://www.espressif.com/sites/default/files/documentation/esp32-wroom-32d_esp32-wroom-32u_datasheet_en.pdf?src-supplier=Digi-Key
footprint ESP32 WROOM 32U
pins: 1 GND (power), 2 3V3 (power), 3 EN, 4 SENSOR_VP, 5 SENSOR_VN, 6 IO34, 7 IO35, 8 IO32, 9 IO33, 10 IO25, 11 IO26, 12 IO27, 13 IO14, 14 IO12, 15 GND (power), 16 IO13, 17 SHD/SD2, 18 SWP/SD3, 19 SCS/CMD, 20 SCK/CLK, 21 SDO/SD0, 22 SDI/SD1, 23 IO15, 24 IO2, 25 IO0, 26 IO4, 27 IO16, 28 IO17, 29 IO5, 30 IO18, 31 IO19, 32 NC, 33 IO21, 34 RXD0, 35 TXD0, 36 IO22, 37 IO23, 38 GND (power), 39 GND (power)

## ESP8266-12F
designator M?
Manufacturer: *; Manufacturer Part Number: *; Local Supplier: thegioiic; Local Supplier Link: https://www.thegioiic.com/products/esp-12f-esp8266-mach-thu-phat-wifi; Local Supplier Part Number: x
footprint ESP8266-12F
pins: 1 ~{RST}, 2 ADC0, 3 ENABLE, 4 GPIO16, 5 GPIO14, 6 GPIO12, 7 GPIO13, 8 VCC, 9 GPIO11, 10 GPIO7, 11 GPIO9, 12 GPIO10, 13 GPIO8, 14 GPIO6, 15 GND, 16 GPIO15, 17 GPIO2, 18 GPIO0, 19 GPIO4, 20 GPIO5, 21 GPIO3, 22 GPIO1

## ESP8266_07 MODULE
designator U?
footprint ESP8266-07 MODULE
pins: 1 RST, 2 ADC, 3 ENA, 4 GPIO16, 5 GPIO14, 6 GPIO12, 7 GPIO13, 8 VCC, 9 GND, 10 GPIO15, 11 GPIO2, 12 GPIO0, 13 GPIO5, 14 GPIO14, 15 RXD, 16 TXD
text: ESP8266 - 07; MODULE

## FUSES-SMD1812
designator F?
footprint FUSES - SMD1812 (4532/SMD1812)
pins: 1 0, 2 1

## GY9250
designator M?
Local Supplier: thegioiic; Local Supplier Part Number: *; Local Supplier Link: https://www.thegioiic.com/products/gy-9250-mach-cam-bien-9dof
footprint GY9250
pins: 1 VCC, 2 GND, 3 SCL, 4 SDA, 5 EDA, 6 ECL, 7 AD0, 8 INT, 9 NCS, 10 FSYNC

## HC12
designator M?
Manufacturer: *; Manufacturer Part Number: *; Local Supplier: thegioiic; Local Supplier Link: https://www.thegioiic.com/products/hc-12-si4463-mach-thu-phat-rf-433mhz-1000m; Local Supplier Part Number: *
footprint HC12
pins: 1 VCC, 2 GND, 3 RXD, 4 TXD, 5 SET

## HC-05-06-SMD
designator M?
Manufacturer: *; Manufacturer Part Number: *; Local Supplier: thegioiic; Local Supplier Part Numer: *; Local Supplier Link: https://www.thegioiic.com/products/hc-05-thu-phat-bluetooth-chua-ra-chan-master-slave
footprint HC-05-06-SMD
pins: 1 UART_TXD, 2 UART_RXD, 3 CTS, 4 RTS, 5 PCM_CLK, 6 PCM_OUT, 7 PCM_IN, 8 PCM_SYNC, 9 AIO0, 10 AIO1, 11 RESET, 12 3V3, 13 GND, 14 NC, 15 USB_D-, 16 CSB, 17 MOSI, 18 MISO, 19 CLK, 20 USB_D+, 21 GND, 22 GND, 23 PIO0, 24 PIO1, 25 PIO2, 26 PIO3, 27 PIO4, 28 PIO5, 29 PIO6, 30 PIO7, 31 PIO8, 32 PIO9, 33 PIO10, 34 PIO11